# Altium footprint library SG__PCB_HOLE_Connector.PcbLib: 154 footprints (part 10 of 10)
Each footprint in its own frame and in the unit in brackets; x right, y up, seen from the top. Pads: shape width x height; smd on the part's side, far side on the other; paste and mask are expansions set on the pad; w line width, h text height; cw(c..) or ccw(c..) is an arc to the next point about the centre after c.
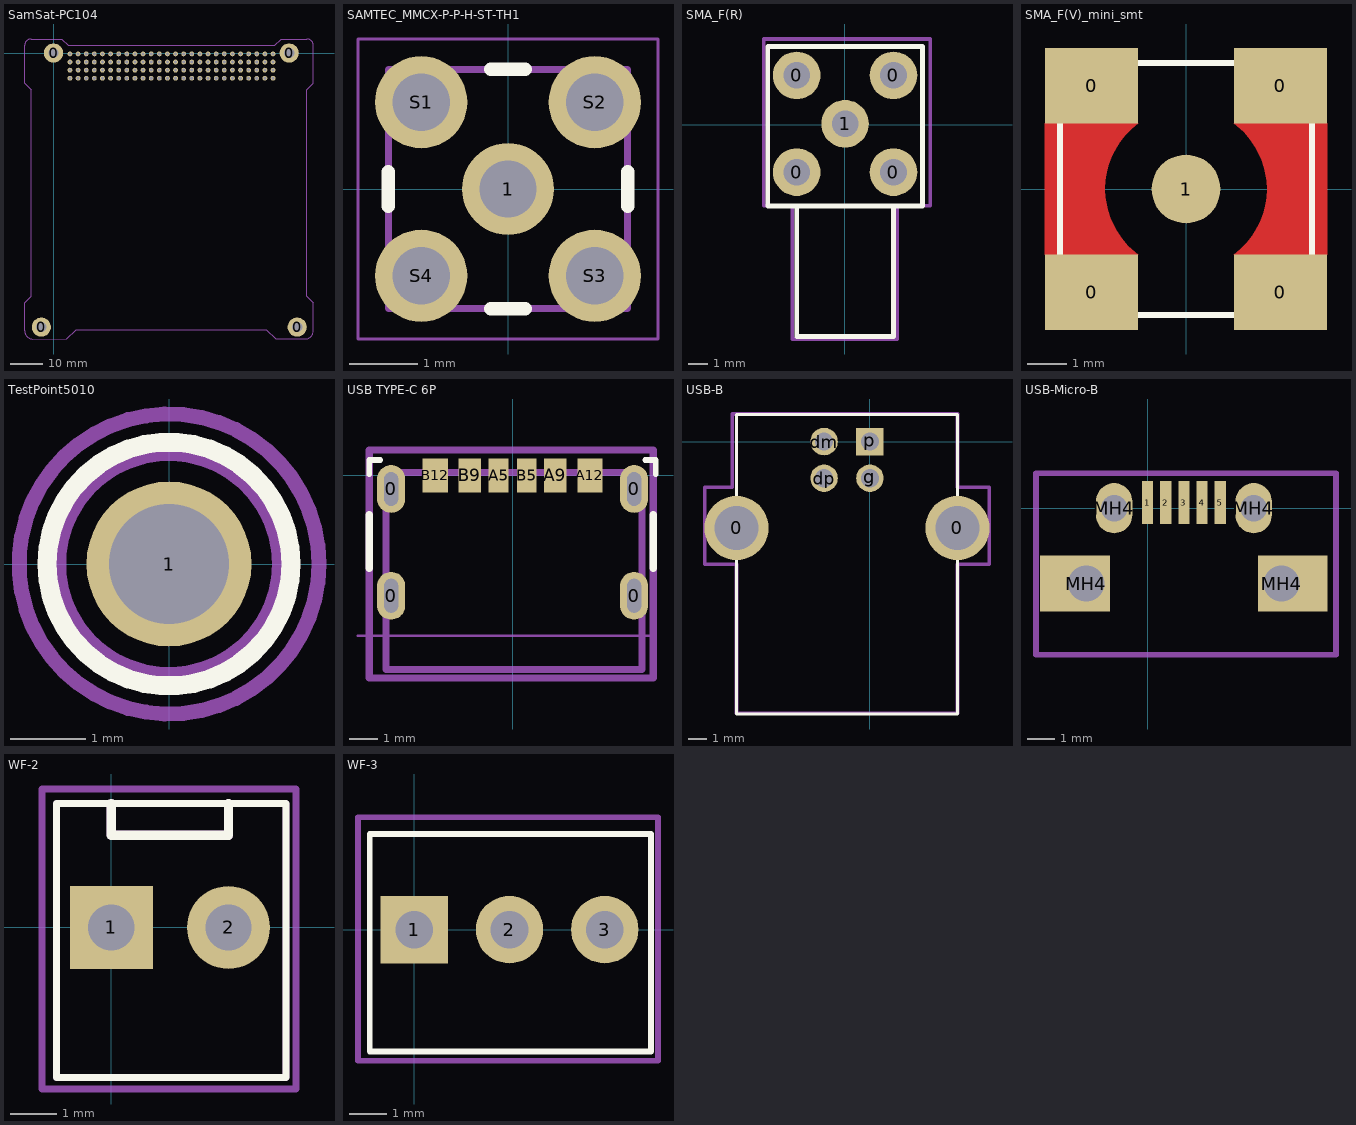
[diagram p9: the footprints below, top view; thin cyan lines are the x and y axes]

## SamSat-PC104 [mm]
pads (108):
  round 6 hole 3.2: 0(-3.8,-85.7) 0(0,0) 0(73.7,0) 0(76.2,-85.7)
  round 1.5 hole 1: 1(5.15,-7.88) 2(5.15,-5.34) 3(7.69,-7.88) 4(7.69,-5.34) 5(10.23,-7.88) 6(10.23,-5.34) 7(12.77,-7.88) 8(12.77,-5.34) 9(15.31,-7.88) 10(15.31,-5.34) 11(17.85,-7.88) 12(17.85,-5.34) 13(20.39,-7.88) 14(20.39,-5.34) 15(22.93,-7.88) 16(22.93,-5.34) 17(25.47,-7.88) 18(25.47,-5.34) 19(28.01,-7.88) 20(28.01,-5.34) 21(30.55,-7.88) 22(30.55,-5.34) 23(33.09,-7.88) 24(33.09,-5.34) 25(35.63,-7.88) 26(35.63,-5.34) 27(38.17,-7.88) 28(38.17,-5.34) 29(40.71,-7.88) 30(40.71,-5.34) 31(43.25,-7.88) 32(43.25,-5.34) 33(45.79,-7.88) 34(45.79,-5.34) 35(48.33,-7.88) 36(48.33,-5.34) 37(50.87,-7.88) 38(50.87,-5.34) 39(53.41,-7.88) 40(53.41,-5.34) 41(55.95,-7.88) 42(55.95,-5.34) 43(58.49,-7.88) 44(58.49,-5.34) 45(61.03,-7.88) 46(61.03,-5.34) 47(63.57,-7.88) 48(63.57,-5.34) 49(66.11,-7.88) 50(66.11,-5.34) 51(68.65,-7.88) 52(68.65,-5.34) 53(5.15,-2.8) 54(5.15,-0.26) 55(7.69,-2.8) 56(7.69,-0.26) 57(10.23,-2.8) 58(10.23,-0.26) 59(12.77,-2.8) 60(12.77,-0.26) 61(15.31,-2.8) 62(15.31,-0.26) 63(17.85,-2.8) 64(17.85,-0.26) 65(20.39,-2.8) 66(20.39,-0.26) 67(22.93,-2.8) 68(22.93,-0.26) 69(25.47,-2.8) 70(25.47,-0.26) 71(28.01,-2.8) 72(28.01,-0.26) 73(30.55,-2.8) 74(30.55,-0.26) 75(33.09,-2.8) 76(33.09,-0.26) 77(35.63,-2.8) 78(35.63,-0.26) 79(38.17,-2.8) 80(38.17,-0.26) 81(40.71,-2.8) 82(40.71,-0.26) 83(43.25,-2.8) 84(43.25,-0.26) 85(45.79,-2.8) 86(45.79,-0.26) 87(48.33,-2.8) 88(48.33,-0.26) 89(50.87,-2.8) 90(50.87,-0.26) 91(53.41,-2.8) 92(53.41,-0.26) 93(55.95,-2.8) 94(55.95,-0.26) 95(58.49,-2.8) 96(58.49,-0.26) 97(61.03,-2.8) 98(61.03,-0.26) 99(63.57,-2.8) 100(63.57,-0.26) 101(66.11,-2.8) 102(66.11,-0.26) 103(68.65,-2.8) 104(68.65,-0.26)
Board Shape:
  lines w0.254: -7.013,-76.129 -7.013,-11.529 -9.03,-9.512 -9.03,2.4 cw(c-7.03,2.4) -7.03,4.4 2.533,4.4 4.55,2.383 69.15,2.383 71.167,4.4 79.27,4.4 cw(c79.27,2.4) 81.27,2.4 81.27,-9.512 79.253,-11.529 79.253,-76.129 ; -7.013,-76.123 -9.03,-78.14 -9.03,-86.892 ccw(c-6.5,-86.892) -6.5,-89.422 4.175,-89.417 7.125,-86.467 66.55,-86.467 69.5,-89.417 78.729,-89.417 ccw(c78.718,-86.865) 81.27,-86.855 81.27,-78.14 79.253,-76.123
3D body "female_header_a-bl254-dg-g26d.stp": height 8.5, standoff -3.2, extent 3.74,-3.96 37.01,1.04
3D body "female_header_a-bl254-dg-g26d.stp": height 8.5, standoff -3.2, extent 36.76,-3.96 70.03,1.04
3D body "female_header_a-bl254-dg-g26d.stp": height 8.5, standoff -3.2, extent 3.74,-9.04 37.01,-4.04
3D body "female_header_a-bl254-dg-g26d.stp": height 8.5, standoff -3.2, extent 36.76,-9.04 70.03,-4.04

## SAMTEC_MMCX-P-P-H-ST-TH1 [mm]
pads (5):
  round 1.348 hole 0.84: 1(0,0) S1(-1.27,1.27) S2(1.27,1.27) S3(1.27,-1.27) S4(-1.27,-1.27)
Top Overlay:
  lines w0.2: -1.75,-0.25 -1.75,0.25 ; -0.25,-1.75 0.25,-1.75 ; -0.25,1.75 0.25,1.75 ; 1.75,-0.25 1.75,0.25
Top Assembly:
  lines w0.1: -1.75,-1.75 -1.75,1.75 1.75,1.75 1.75,-1.75 -1.75,-1.75
Top Courtyard:
  lines w0.05: -2.195,-2.195 2.195,-2.195 2.195,2.195 -2.195,2.195 -2.195,-2.195
3D body "MMCX-P-P-H-ST-TH1.stp": height 5.35, standoff -2.05, extent -1.75,-1.75 1.75,1.75

## SMA_F(R) [mm]
pads (5):
  round 2.5 hole 1.4: 0(-2.515,-2.49) 0(-2.515,2.59) 0(2.565,-2.49) 0(2.565,2.59) 1(0.025,0.05)
Top Overlay:
  lines w0.254: -2.515,-4.268 -2.515,-11.126 2.565,-11.126 2.565,-4.268 ; -4.039,-4.268 -4.039,4.114 4.089,4.114 4.089,-3.76 4.089,-4.268 -4.039,-4.268
Top Courtyard:
  lines w0.2: -4.25,-4.25 -4.25,4.5 4.5,4.5 4.5,-4.25 2.75,-4.25 2.75,-11.25 -2.75,-11.25 -2.75,-4.25 -4.25,-4.25
3D body "SMA-F (R).step": height 11.86, standoff -2.24, extent -3.419,-11.31 3.581,3.79

## SMA_F(V)_mini_smt [mm] "rf con"
pads (5):
  rect 2.35x1.908 smd: 0(-2.38,-2.606) 0(-2.38,2.606) 0(2.38,-2.606) 0(2.38,2.606)
  round 1.73 smd: 1(0,0)
Top Layer:
  region: 3.555,-1.652 1.205,-1.652 1.381,-1.509 1.529,-1.358 1.668,-1.184 1.75,-1.058 1.859,-0.852 1.948,-0.624 2,-0.426 2.033,-0.224 2.045,0 2.034,0.212 1.978,0.521 1.896,0.767 1.75,1.058 1.622,1.246 1.464,1.428 1.205,1.652 3.555,1.652
  region: -3.555,1.652 -1.205,1.652 -1.381,1.509 -1.529,1.358 -1.668,1.184 -1.75,1.058 -1.859,0.852 -1.948,0.624 -2,0.426 -2.033,0.224 -2.045,0 -2.034,-0.212 -1.978,-0.521 -1.896,-0.767 -1.75,-1.058 -1.622,-1.246 -1.464,-1.428 -1.205,-1.652 -3.555,-1.652
Top Overlay:
  lines w0.152: -3.175,-3.175 3.175,-3.175 3.175,3.172 -3.175,3.172 -3.175,-3.175 ; -3.175,-3.175 -3.175,-3.175
3D body: height 8.84, standoff 0, extent -3.175,-3.172 3.175,3.172
3D body: height 2.29, standoff 0, extent -3.175,-3.175 3.175,3.175

## TestPoint5010 [mm]
pads (1):
  round 2.2 hole 1.6: 1(0,0)
Top Overlay:
  circle w0.254: c0,0 r1.626
Top Assembly:
  circle w0.254: c0,0 r1.5
Top Courtyard:
  circle w0.2: c0,0 r2
3D body "TEST POINT RED Keystone 5010.step": height 8.13, standoff -3.1, extent -1.587,-1.587 1.588,1.587

## USB TYPE-C 6P [mm] "USB Type-C Connector with 6 pins"
height 2.667
pads (10):
  oval 1x1.7 hole 0.5 slot 1.2 at 90 deg: 0(-4.32,-4.28) 0(-4.32,-0.48) 0(4.32,-4.28) 0(4.32,-0.48)
  rect 0.7x1.2 smd: A5(-0.5,0) B5(0.5,0)
  rect 0.8x1.2 smd: A9(1.52,0) B9(-1.52,0)
  rect 0.9x1.2 smd: A12(2.75,0) B12(-2.75,0)
Top Overlay:
  lines w0.2: -5.095,0.041 -5.095,0.549 -4.714,0.549 ; 4.714,0.549 5.095,0.549 5.095,0.041
  lines w0.254: -5.1,-3.3 -5.1,-1.4 ; 5,-3.3 5,-1.4
Top Assembly:
  lines w0.254: -4.5,-6.9 4.6,-6.9 4.6,0.1 -4.5,0.1 -4.5,-6.9
Dimensions:
  lines w0.1: -5.5,-5.7 5,-5.7
  text "Board edge" at 3.9,-6 h0.2
Top Courtyard:
  lines w0.254: -5.1,-7.2 5,-7.2 5,0.9 -5.1,0.9 -5.1,-7.2
3D body "USB Connector Type C female 6pin.STEP": height 3.2, standoff -1.02, extent -4.47,-6.9 4.47,-0.03

## USB-B [mm]
pads (6):
  round 3.5 hole 2.4 mask+0.05: 0(-7.27,-4.71) 0(4.77,-4.71)
  round 1.5 hole 1 mask+0.05: dm(-2.5,0) dp(-2.5,-2) g(0,-2)
  rect 1.5x1.5 hole 1 mask+0.05: p(0,0)
Top Overlay:
  lines w0.15: -7.27,-14.85 -7.27,1.475 4.77,1.475 4.77,-14.85 -7.27,-14.85
Top Courtyard:
  lines w0.2: -9,-6.687 -7.27,-6.687 -7.27,-14.808 4.77,-14.808 4.77,-6.687 6.5,-6.687 6.5,-2.5 4.77,-2.5 4.77,1.5 -7.5,1.5 -7.5,-2.5 -9,-2.5 -9,-2.75 -9,-6.687
3D body "USB B.STEP": height 12, standoff -2.64, extent -8.675,-15 6.123,1.5

## USB-Micro-B [mm]
pads (9):
  rect 0.4x1.55 smd: 1(0,0.2) 2(0.65,0.2) 3(1.3,0.2) 4(1.95,0.2) 5(2.6,0.2)
  rect 2.5x2 hole 1.3 copper offset -0.4,0: MH4(-2.2,-2.7)
  oval 1.3x1.8 hole 0.95: MH4(-1.2,0) MH4(3.8,0)
  rect 2.5x2 hole 1.3 copper offset 0.4,0: MH4(4.8,-2.7)
Top Courtyard:
  lines w0.2: -4,-5.25 -4,1.25 6.75,1.25 6.75,-5.25 -4,-5.25
3D body "Micro USB-B Female 5Pin SMD.STEP": height 2.7, standoff -1.02, extent -2.7,-5.325 5.35,0.475

## WF-2 [mm]
height 12
pads (2):
  rect 1.8x1.8 hole 1: 1(0,0)
  round 1.8 hole 1: 2(2.54,0)
Top Overlay:
  lines w0.152: -1.185,2.549 -1.185,-3.251 ; -1.185,-3.251 3.786,-3.251 3.786,2.686 -1.185,2.686 -1.185,-3.251
  lines w0.2: 0,2.686 0,2 2.54,2 2.54,2.686
Top Assembly:
  lines w0.152: -1.185,2.549 -1.185,-3.251 ; -1.185,-3.251 -1.185,2.686 3.786,2.686 3.786,-3.251 -1.185,-3.251
  lines w0.2: 0,2.686 0,2 2.54,2 2.54,2.686
Top Courtyard:
  lines w0.152: -1.5,-3.5 -1.5,3 4,3 4,-3.5 -1.5,-3.5
3D body "WF-2.STEP": height 2.28, standoff -12.12, extent -1.175,-3.178 3.825,2.622

## WF-3 [mm]
height 12
pads (3):
  rect 1.8x1.8 hole 1: 1(0,0)
  round 1.8 hole 1: 2(2.54,0) 3(5.08,0)
Top Overlay:
  lines w0.152: -1.185,-3.251 6.315,-3.251 ; -1.185,-3.251 -1.185,2.549 ; -1.185,-3.251 6.315,-3.251 ; -1.185,-3.251 -1.185,2.549 ; -1.185,2.549 6.315,2.549 ; -1.185,2.549 6.315,2.549 ; 6.315,-3.251 6.315,2.549 ; 6.315,-3.251 6.315,2.549
Top Courtyard:
  lines w0.152: -1.5,-3.5 -1.5,3 6.5,3 6.5,-3.5 -1.5,-3.5
3D body "WF-3-1.STEP": height 11.62, standoff -2.78, extent -1.185,-3.251 6.315,2.549